# Altium footprint library Indruino.PcbLib: 383 footprints (part 5 of 24)
Each footprint in its own frame and in the unit in brackets; x right, y up, seen from the top. Pads: shape width x height; smd on the part's side, far side on the other; paste and mask are expansions set on the pad; w line width, h text height; cw(c..) or ccw(c..) is an arc to the next point about the centre after c.
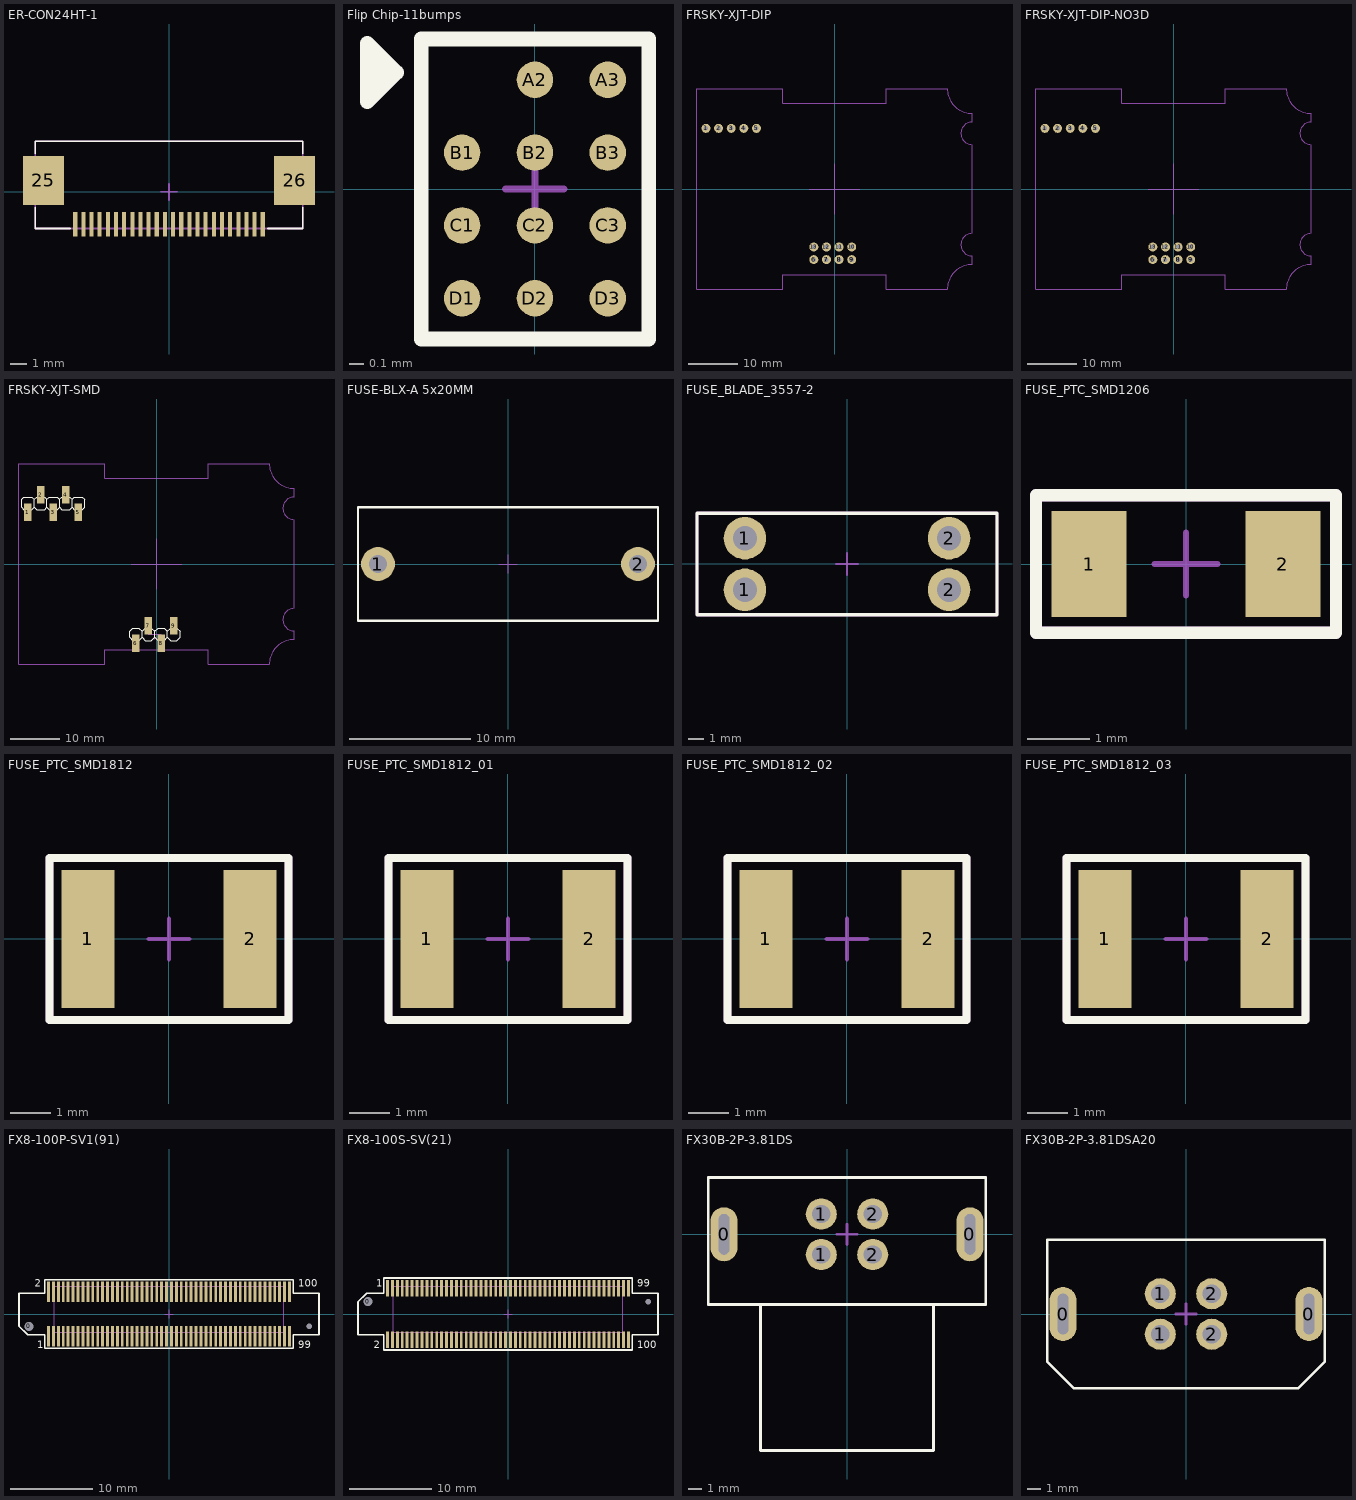
[diagram p4: the footprints below, top view; thin cyan lines are the x and y axes]

## ER-CON24HT-1 [mm]
pads (26):
  rect 0.25x1.5 smd: 1(-5.75,-2) 2(-5.25,-2) 3(-4.75,-2) 4(-4.25,-2) 5(-3.75,-2) 6(-3.25,-2) 7(-2.75,-2) 8(-2.25,-2) 9(-1.75,-2) 10(-1.25,-2) 11(-0.75,-2) 12(-0.25,-2) 13(0.25,-2) 14(0.75,-2) 15(1.25,-2) 16(1.75,-2) 17(2.25,-2) 18(2.75,-2) 19(3.25,-2) 20(3.75,-2) 21(4.25,-2) 22(4.75,-2) 23(5.25,-2) 24(5.75,-2)
  rect 2.5x3 smd: 25(-7.7,0.7) 26(7.7,0.7)
Top Overlay:
  lines w0.1: -8.2,-0.95 -8.2,-2.25 -6.05,-2.25 ; -8.2,2.35 -8.2,3.1 8.2,3.1 8.2,2.35 ; 6.05,-2.25 8.2,-2.25 8.2,-0.95
Mechanical 13:
  lines w0.1: -8.2,-2.25 -8.2,3.1 8.2,3.1 8.2,-2.25 -8.2,-2.25
Mechanical 15:
  lines w0.1: -0.5,0 0.5,0 ; 0,-0.5 0,0.5
3D body: height 2, standoff 0, extent -8.2,-2.25 8.2,3.1

## Flip Chip-11bumps [mm]
pads (11):
  round 0.25 smd: A2(0,0.75) A3(0.5,0.75) B1(-0.5,0.25) B2(0,0.25) B3(0.5,0.25) C1(-0.5,-0.25) C2(0,-0.25) C3(0.5,-0.25) D1(-0.5,-0.75) D2(0,-0.75) D3(0.5,-0.75)
Top Overlay:
  region: -1.15,0.6 -1.15,1 -0.95,0.8
  lines w0.1: -0.95,0.8 -0.95,0.8 ; -0.95,0.8 -1.15,0.6 -1.15,1 -0.95,0.8 ; -0.78,-1.03 -0.78,1.03 0.78,1.03 0.78,-1.03 -0.78,-1.03
Mechanical 13:
  lines w0.05: -0.78,-1.03 0.78,-1.03 0.78,1.03 -0.78,1.03 -0.78,-1.03
Mechanical 15:
  lines w0.05: -0.2,0 0.2,0 ; 0,-0.2 0,0.2
3D body: height 0.65, standoff 0, extent -0.72,-0.975 0.725,0.965

## FRSKY-XJT-DIP [mm] "FrSky 2.4G RADIO SYSTEM XJT Module"
pads (16):
  round 1.8 hole 0.9: 1(-25.875,12.2) 2(-23.335,12.2) 3(-20.795,12.2) 4(-18.255,12.2) 5(-15.715,12.2) 6(-4.175,-14.2) 7(-1.635,-14.2) 7(-1.635,-14.2) 8(0.905,-14.2) 8(0.905,-14.2) 9(3.445,-14.2) 9(3.445,-14.2) 10(3.445,-11.66) 11(0.905,-11.66) 12(-1.635,-11.66) 13(-4.175,-11.66)
Mechanical 13:
  lines w0.2: -27.675,-20.2 -27.675,20.2 -10.375,20.2 -10.375,17.2 10.375,17.2 10.375,20.2 22.675,20.2 ccw(c27.675,20.2) 27.675,15.2 27.675,13.45 ccw(c27.675,11.2) 27.675,8.95 27.675,-8.95 ccw(c27.675,-11.2) 27.675,-13.45 27.675,-15.2 ccw(c27.675,-20.2) 22.675,-20.2 10.375,-20.2 10.375,-17.2 -10.375,-17.2 -10.375,-20.2 -27.675,-20.2
Mechanical 15:
  lines w0.2: -5.08,0 5.08,0 ; 0,-5.08 0,5.08
3D body "Moude_XJT.step": height 12.6, standoff -1.99, extent -27.68,-20.2 27.67,20.2

## FRSKY-XJT-DIP-NO3D [mm] "FrSky 2.4G RADIO SYSTEM XJT Module"
pads (16):
  round 1.8 hole 0.9: 1(-25.875,12.2) 2(-23.335,12.2) 3(-20.795,12.2) 4(-18.255,12.2) 5(-15.715,12.2) 6(-4.175,-14.2) 7(-1.635,-14.2) 7(-1.635,-14.2) 8(0.905,-14.2) 8(0.905,-14.2) 9(3.445,-14.2) 9(3.445,-14.2) 10(3.445,-11.66) 11(0.905,-11.66) 12(-1.635,-11.66) 13(-4.175,-11.66)
Mechanical 13:
  lines w0.2: -27.675,-20.2 -10.375,-20.2 -10.375,-17.2 10.375,-17.2 10.375,-20.2 22.675,-20.2 cw(c27.675,-20.2) 27.675,-15.2 27.675,-13.45 cw(c27.675,-11.2) 27.675,-8.95 27.675,8.95 cw(c27.675,11.2) 27.675,13.45 27.675,15.2 cw(c27.675,20.2) 22.675,20.2 10.375,20.2 10.375,17.2 -10.375,17.2 -10.375,20.2 -27.675,20.2 -27.675,-20.2
Mechanical 15:
  lines w0.2: -5.08,0 5.08,0 ; 0,-5.08 0,5.08

## FRSKY-XJT-SMD [mm] "FrSky 2.4G RADIO SYSTEM XJT Module"
pads (9):
  rect 1.5x3.5 smd: 1(-25.875,10.45) 2(-23.335,13.95) 3(-20.795,10.45) 4(-18.255,13.95) 5(-15.715,10.45) 6(-4.175,-15.91) 7(-1.635,-12.41) 8(0.905,-15.91) 9(3.445,-12.41)
Top Overlay:
  lines w0.2: -20.01,13.465 -21.59,13.465 -22.065,12.99 ; -20.005,13.47 -19.535,13 -19.065,13.47 -17.455,13.47 -16.985,13 ; -19.525,13 -19.525,11.4 ; -16.985,11.39 -16.985,13 ; -16.54,10.935 -16.995,11.39 -17.455,10.93 -19.055,10.93 -19.525,11.4 ; -16.535,10.93 -14.905,10.93 -14.445,11.39 -14.445,13 -14.915,13.47 -16.515,13.47 -16.985,13 ; -4.778,-15.427 -3.578,-15.427 -2.905,-14.755 ; -4.775,-15.43 -5.445,-14.76 -5.445,-13.565 -4.773,-12.892 -3.578,-12.892 -2.905,-13.565 ; 2.847,-15.427 2.175,-14.755 ; 2.85,-15.43 4.045,-15.43 4.715,-14.76 4.715,-13.565 4.042,-12.892 2.847,-12.892 2.175,-13.565 ; -24.605,11.4 -24.605,13 ; -24.605,11.4 -25.07,10.935 -26.68,10.935 -27.145,11.4 -27.145,13 -26.675,13.47 -25.075,13.47 -24.605,13 ; -24.605,11.4 -24.135,10.93 -22.535,10.93 -22.065,11.4 ; -24.605,13 -24.135,13.47 -22.545,13.47 -22.065,12.99 ; -22.065,11.4 -22.065,12.99 ; -22.065,11.4 -21.595,10.93 -19.995,10.93 -19.525,11.4 ; -2.905,-14.755 -2.233,-15.427 -1.038,-15.427 -0.365,-14.755 ; -2.905,-14.755 -2.905,-13.565 ; -2.905,-13.565 -2.233,-12.892 -1.038,-12.892 -0.365,-13.565 ; -0.365,-14.755 0.307,-15.427 1.502,-15.427 2.175,-14.755 ; -0.365,-14.755 -0.365,-13.565 ; -0.365,-13.565 0.307,-12.892 1.502,-12.892 2.175,-13.565 ; 2.175,-14.755 2.175,-13.565
Mechanical 1:
  text "BOTTOM" at 8.603,-4.233 h1.52
Mechanical 15:
  lines w0.2: -5.08,0 5.08,0 ; -1.635,-14.12 0.905,-14.12 ; -0.365,-15.185 -0.365,-14.12 -0.365,-13.32 ; 0,-5.08 0,5.08 ; -27.675,-20.2 -10.375,-20.2 -10.375,-17.2 10.375,-17.2 10.375,-20.2 22.675,-20.2 cw(c27.675,-20.2) 27.675,-15.2 27.675,-13.45 cw(c27.675,-11.2) 27.675,-8.95 27.675,8.95 cw(c27.675,11.2) 27.675,13.45 27.675,15.2 cw(c27.675,20.2) 22.675,20.2 10.375,20.2 10.375,17.2 -10.375,17.2 -10.375,20.2 -27.675,20.2 -27.675,-20.2
3D body "pin_header_a-sl254-eg-g05mp1.stp": height 9.8, standoff -0.04, extent -27.145,9.7 -14.445,14.7
3D body "pin_header_a-sl254-eg-g04mp1.stp": height 9.8, standoff -0.04, extent -5.445,-16.66 4.715,-11.66

## FUSE-BLX-A 5x20MM [mm] "5x20mm"
pads (2):
  round 2.8 hole 1.5: 1(-10.75,0) 2(10.75,0)
Top Overlay:
  lines w0.2: -12.4,-4.7 12.4,-4.7 12.4,4.7 -12.4,4.7 -12.4,-4.7
Mechanical 15:
  lines w0.1: -0.75,0 0.75,0 ; 0,-0.75 0,0.75
3D body "User Library-MF563.STEP": height 12.5, standoff -2.81, extent -12.25,-4.75 12.25,4.75

## FUSE_BLADE_3557-2 [mm] "Keystone Electronics, FUSE BLOCK BLADE, 10.92mm x 3.81mm x 16.25mm"
height 16.25
pads (4):
  round 2.8 hole 1.6: 1(-6.735,-1.7) 1(-6.735,1.7) 2(6.735,-1.7) 2(6.735,1.7)
Top Overlay:
  lines w0.2: -9.9,-3.35 9.9,-3.35 9.9,3.35 -9.9,3.35 -9.9,-3.35
Mechanical 13:
  lines w0.2: -9.9,-3.35 -9.9,3.35 9.9,3.35 9.9,-3.35 -9.9,-3.35
Mechanical 15:
  lines w0.1: -0.75,0 0.75,0 ; 0,-0.75 0,0.75
3D body "User Library-ATO Fuse.step": height 20.42, standoff 1.34, extent -9.61,-2.54 9.61,2.54

## FUSE_PTC_SMD1206 [mm] "Chip Resistor, Body 3.2x1.6mm, IPC High Density"
height 0.71
pads (2):
  rect 1.2x1.7 smd: 1(-1.55,0) 2(1.55,0)
Top Overlay:
  lines w0.2: -2.4,-1.1 -2.4,1.1 2.4,1.1 2.4,-1.1 -2.4,-1.1
Mechanical 13:
  lines w0.2: -2.4,-1.1 -2.4,1.1 2.4,1.1 2.4,-1.1 -2.4,-1.1
  text "'.Designator'" at -1.95,-0.333 h0.8
Mechanical 15:
  lines w0.1: -0.5,0 0.5,0 ; 0,-0.5 0,0.5
3D body "User Library-SF-1206F.step": height 0.61, standoff 0, extent -1.55,-0.775 1.55,0.775

## FUSE_PTC_SMD1812 [mm]
pads (2):
  rect 1.3x3.4 smd: 1(-2,0) 2(2,0)
Top Overlay:
  lines w0.2: -2.95,-2 2.95,-2 2.95,2 -2.95,2 -2.95,-2
Mechanical 13:
  lines w0.2: -2.95,-2 -2.95,2 2.95,2 2.95,-2 -2.95,-2
  text "'.Designator'" at -2.4,-0.5 h1.2
Mechanical 15:
  lines w0.1: -0.5,0 0.5,0 ; 0,-0.5 0,0.5
3D body "SW3dPS-1812L.STEP": height 1.34, standoff 0, extent -2.355,-1.705 2.375,1.705

## FUSE_PTC_SMD1812_01 [mm]
pads (2):
  rect 1.3x3.4 smd: 1(-2,0) 2(2,0)
Top Overlay:
  lines w0.2: -2.95,-2 -2.95,2 2.95,2 2.95,-2 -2.95,-2
Mechanical 13:
  lines w0.2: -2.95,-2 2.95,-2 2.95,2 -2.95,2 -2.95,-2
  text "'.Designator'" at -2.4,-0.5 h1.2
Mechanical 15:
  lines w0.1: -0.5,0 0.5,0 ; 0,-0.5 0,0.5
3D body "User Library-fuse1812.step": height 1.32, standoff 0, extent -2.4,-1.61 2.42,1.61

## FUSE_PTC_SMD1812_02 [mm]
pads (2):
  rect 1.3x3.4 smd: 1(-2,0) 2(2,0)
Top Overlay:
  lines w0.2: -2.95,-2 2.95,-2 2.95,2 -2.95,2 -2.95,-2
Mechanical 13:
  lines w0.2: -2.95,-2 -2.95,2 2.95,2 2.95,-2 -2.95,-2
  text "'.Designator'" at -2.4,-0.5 h1.2
Mechanical 15:
  lines w0.1: -0.5,0 0.5,0 ; 0,-0.5 0,0.5
3D body "User Library-0ZCG-0_70mm.step": height 0.91, standoff 0.01, extent -2.25,-1.6 2.25,1.6

## FUSE_PTC_SMD1812_03 [mm]
pads (2):
  rect 1.3x3.4 smd: 1(-2,0) 2(2,0)
Top Overlay:
  lines w0.2: -2.95,-2 2.95,-2 2.95,2 -2.95,2 -2.95,-2
Mechanical 13:
  lines w0.2: -2.95,-2 -2.95,2 2.95,2 2.95,-2 -2.95,-2
  text "'.Designator'" at -2.4,-0.5 h1.2
Mechanical 15:
  lines w0.1: -0.5,0 0.5,0 ; 0,-0.5 0,0.5
3D body "User Library-R1812-PTC.step": height 1.11, standoff 0.01, extent -2.33,-1.65 2.33,1.65

## FX8-100P-SV1(91) [mm]
pads (102):
  round 1 hole 1.1: 0(-17.1,-1.5)
  round 0.6 hole 0.7: 0(17.1,-1.5)
  rect 0.35x2.5 smd: 1(-14.7,-2.7) 2(-14.7,2.7) 3(-14.1,-2.7) 4(-14.1,2.7) 5(-13.5,-2.7) 6(-13.5,2.7) 7(-12.9,-2.7) 8(-12.9,2.7) 9(-12.3,-2.7) 10(-12.3,2.7) 11(-11.7,-2.7) 12(-11.7,2.7) 13(-11.1,-2.7) 14(-11.1,2.7) 15(-10.5,-2.7) 16(-10.5,2.7) 17(-9.9,-2.7) 18(-9.9,2.7) 19(-9.3,-2.7) 20(-9.3,2.7) 21(-8.7,-2.7) 22(-8.7,2.7) 23(-8.1,-2.7) 24(-8.1,2.7) 25(-7.5,-2.7) 26(-7.5,2.7) 27(-6.9,-2.7) 28(-6.9,2.7) 29(-6.3,-2.7) 30(-6.3,2.7) 31(-5.7,-2.7) 32(-5.7,2.7) 33(-5.1,-2.7) 34(-5.1,2.7) 35(-4.5,-2.7) 36(-4.5,2.7) 37(-3.9,-2.7) 38(-3.9,2.7) 39(-3.3,-2.7) 40(-3.3,2.7) 41(-2.7,-2.7) 42(-2.7,2.7) 43(-2.1,-2.7) 44(-2.1,2.7) 45(-1.5,-2.7) 46(-1.5,2.7) 47(-0.9,-2.7) 48(-0.9,2.7) 49(-0.3,-2.7) 50(-0.3,2.7) 51(0.3,-2.7) 52(0.3,2.7) 53(0.9,-2.7) 54(0.9,2.7) 55(1.5,-2.7) 56(1.5,2.7) 57(2.1,-2.7) 58(2.1,2.7) 59(2.7,-2.7) 60(2.7,2.7) 61(3.3,-2.7) 62(3.3,2.7) 63(3.9,-2.7) 64(3.9,2.7) 65(4.5,-2.7) 66(4.5,2.7) 67(5.1,-2.7) 68(5.1,2.7) 69(5.7,-2.7) 70(5.7,2.7) 71(6.3,-2.7) 72(6.3,2.7) 73(6.9,-2.7) 74(6.9,2.7) 75(7.5,-2.7) 76(7.5,2.7) 77(8.1,-2.7) 78(8.1,2.7) 79(8.7,-2.7) 80(8.7,2.7) 81(9.3,-2.7) 82(9.3,2.7) 83(9.9,-2.7) 84(9.9,2.7) 85(10.5,-2.7) 86(10.5,2.7) 87(11.1,-2.7) 88(11.1,2.7) 89(11.7,-2.7) 90(11.7,2.7) 91(12.3,-2.7) 92(12.3,2.7) 93(12.9,-2.7) 94(12.9,2.7) 95(13.5,-2.7) 96(13.5,2.7) 97(14.1,-2.7) 98(14.1,2.7) 99(14.7,-2.7) 100(14.7,2.7)
Top Overlay:
  lines w0.2: -18.3,-1.5 -18.3,2.55 -15.15,2.55 -15.15,4.2 15.15,4.2 15.15,2.55 18.3,2.55 18.3,-2.55 15.15,-2.55 15.15,-4.2 -15.15,-4.2 -15.15,-2.55 -17.25,-2.55 -18.3,-1.5
  text "99" at 15.75,-4.2 h0.9
  text "100" at 15.75,3.3 h0.9
  text "2" at -16.35,3.3 h0.9
  text "1" at -16.05,-4.2 h0.9
Mechanical 13:
  lines w0.1: -14,-2.25 -14,3.375 14,3.375 14,-2.25 -14,-2.25
Mechanical 15:
  lines w0.1: -0.5,0 0.5,0 ; 0,-0.5 0,0.5
3D body "FX8-100P-SV1.stp": height 3.8, standoff -0.85, extent -18.3,-3.25 18.3,3.25

## FX8-100S-SV(21) [mm]
pads (102):
  round 1 hole 1.1: 0(-17.1,1.5)
  round 0.6 hole 0.7: 0(17.1,1.5)
  rect 0.35x2 smd: 1(-14.7,3.15) 2(-14.7,-3.15) 3(-14.1,3.15) 4(-14.1,-3.15) 5(-13.5,3.15) 6(-13.5,-3.15) 7(-12.9,3.15) 8(-12.9,-3.15) 9(-12.3,3.15) 10(-12.3,-3.15) 11(-11.7,3.15) 12(-11.7,-3.15) 13(-11.1,3.15) 14(-11.1,-3.15) 15(-10.5,3.15) 16(-10.5,-3.15) 17(-9.9,3.15) 18(-9.9,-3.15) 19(-9.3,3.15) 20(-9.3,-3.15) 21(-8.7,3.15) 22(-8.7,-3.15) 23(-8.1,3.15) 24(-8.1,-3.15) 25(-7.5,3.15) 26(-7.5,-3.15) 27(-6.9,3.15) 28(-6.9,-3.15) 29(-6.3,3.15) 30(-6.3,-3.15) 31(-5.7,3.15) 32(-5.7,-3.15) 33(-5.1,3.15) 34(-5.1,-3.15) 35(-4.5,3.15) 36(-4.5,-3.15) 37(-3.9,3.15) 38(-3.9,-3.15) 39(-3.3,3.15) 40(-3.3,-3.15) 41(-2.7,3.15) 42(-2.7,-3.15) 43(-2.1,3.15) 44(-2.1,-3.15) 45(-1.5,3.15) 46(-1.5,-3.15) 47(-0.9,3.15) 48(-0.9,-3.15) 49(-0.3,3.15) 50(-0.3,-3.15) 51(0.3,3.15) 52(0.3,-3.15) 53(0.9,3.15) 54(0.9,-3.15) 55(1.5,3.15) 56(1.5,-3.15) 57(2.1,3.15) 58(2.1,-3.15) 59(2.7,3.15) 60(2.7,-3.15) 61(3.3,3.15) 62(3.3,-3.15) 63(3.9,3.15) 64(3.9,-3.15) 65(4.5,3.15) 66(4.5,-3.15) 67(5.1,3.15) 68(5.1,-3.15) 69(5.7,3.15) 70(5.7,-3.15) 71(6.3,3.15) 72(6.3,-3.15) 73(6.9,3.15) 74(6.9,-3.15) 75(7.5,3.15) 76(7.5,-3.15) 77(8.1,3.15) 78(8.1,-3.15) 79(8.7,3.15) 80(8.7,-3.15) 81(9.3,3.15) 82(9.3,-3.15) 83(9.9,3.15) 84(9.9,-3.15) 85(10.5,3.15) 86(10.5,-3.15) 87(11.1,3.15) 88(11.1,-3.15) 89(11.7,3.15) 90(11.7,-3.15) 91(12.3,3.15) 92(12.3,-3.15) 93(12.9,3.15) 94(12.9,-3.15) 95(13.5,3.15) 96(13.5,-3.15) 97(14.1,3.15) 98(14.1,-3.15) 99(14.7,3.15) 100(14.7,-3.15)
Top Overlay:
  lines w0.2: -18.3,-2.55 -15.15,-2.55 -15.15,-4.4 15.15,-4.4 15.15,-2.55 18.3,-2.55 18.3,2.55 15.15,2.55 15.15,4.4 -15.15,4.4 -15.15,2.55 -17.25,2.55 -18.3,1.5 -18.3,-2.55
  text "1" at -16.05,3.3 h0.9
  text "2" at -16.35,-4.2 h0.9
  text "100" at 15.75,-4.2 h0.9
  text "99" at 15.75,3.3 h0.9
Mechanical 13:
  lines w0.1: -14,-2.25 14,-2.25 14,3.375 -14,3.375 -14,-2.25
Mechanical 15:
  lines w0.1: -0.5,0 0.5,0 ; 0,-0.5 0,0.5
3D body "FX8-100S-SV.stp": height 2.26, standoff -0.74, extent -18.3,-3.5 18.3,3.5

## FX30B-2P-3.81DS [mm]
pads (6):
  oval 2x4 hole 0.8 slot 3 at 90 deg: 0(-9.105,0) 0(9.105,0)
  round 2.3 hole 1.35: 1(-1.905,-1.5) 1(-1.905,1.5) 2(1.905,-1.5) 2(1.905,1.5)
Top Overlay:
  lines w0.2: -6.405,-5.2 -6.405,-16 6.405,-16 6.405,-5.2 ; -10.28,-5.2 10.28,-5.2 10.28,4.2 -10.28,4.2 -10.28,-5.2
Mechanical 15:
  lines w0.2: -0.75,0 0.75,0 ; 0,-0.75 0,0.75
3D body "FX30B-2P-3.81DS.stp": height 11.02, standoff -3.28, extent -10.28,-16 10.28,4.2

## FX30B-2P-3.81DSA20 [mm]
pads (6):
  oval 2x4 hole 0.8 slot 3 at 90 deg: 0(-9.105,0) 0(9.105,0)
  round 2.3 hole 1.35: 1(-1.905,-1.5) 1(-1.905,1.5) 2(1.905,-1.5) 2(1.905,1.5)
Top Overlay:
  lines w0.2: -10.28,-3.52 -10.28,5.5 10.28,5.5 10.28,-3.52 8.3,-5.5 -8.3,-5.5 -10.28,-3.52
Mechanical 15:
  lines w0.2: -0.75,0 0.75,0 ; 0,-0.75 0,0.75
3D body "FX30B-2P-3.81DSA20.stp": height 14.23, standoff -3.27, extent -10.28,-5.5 10.28,5.5